# Altium footprint library Transformer_E.PcbLib: 16 footprints
Each footprint in its own frame and in the unit in brackets; x right, y up, seen from the top. Pads: shape width x height; smd on the part's side, far side on the other; paste and mask are expansions set on the pad; w line width, h text height; cw(c..) or ccw(c..) is an arc to the next point about the centre after c.
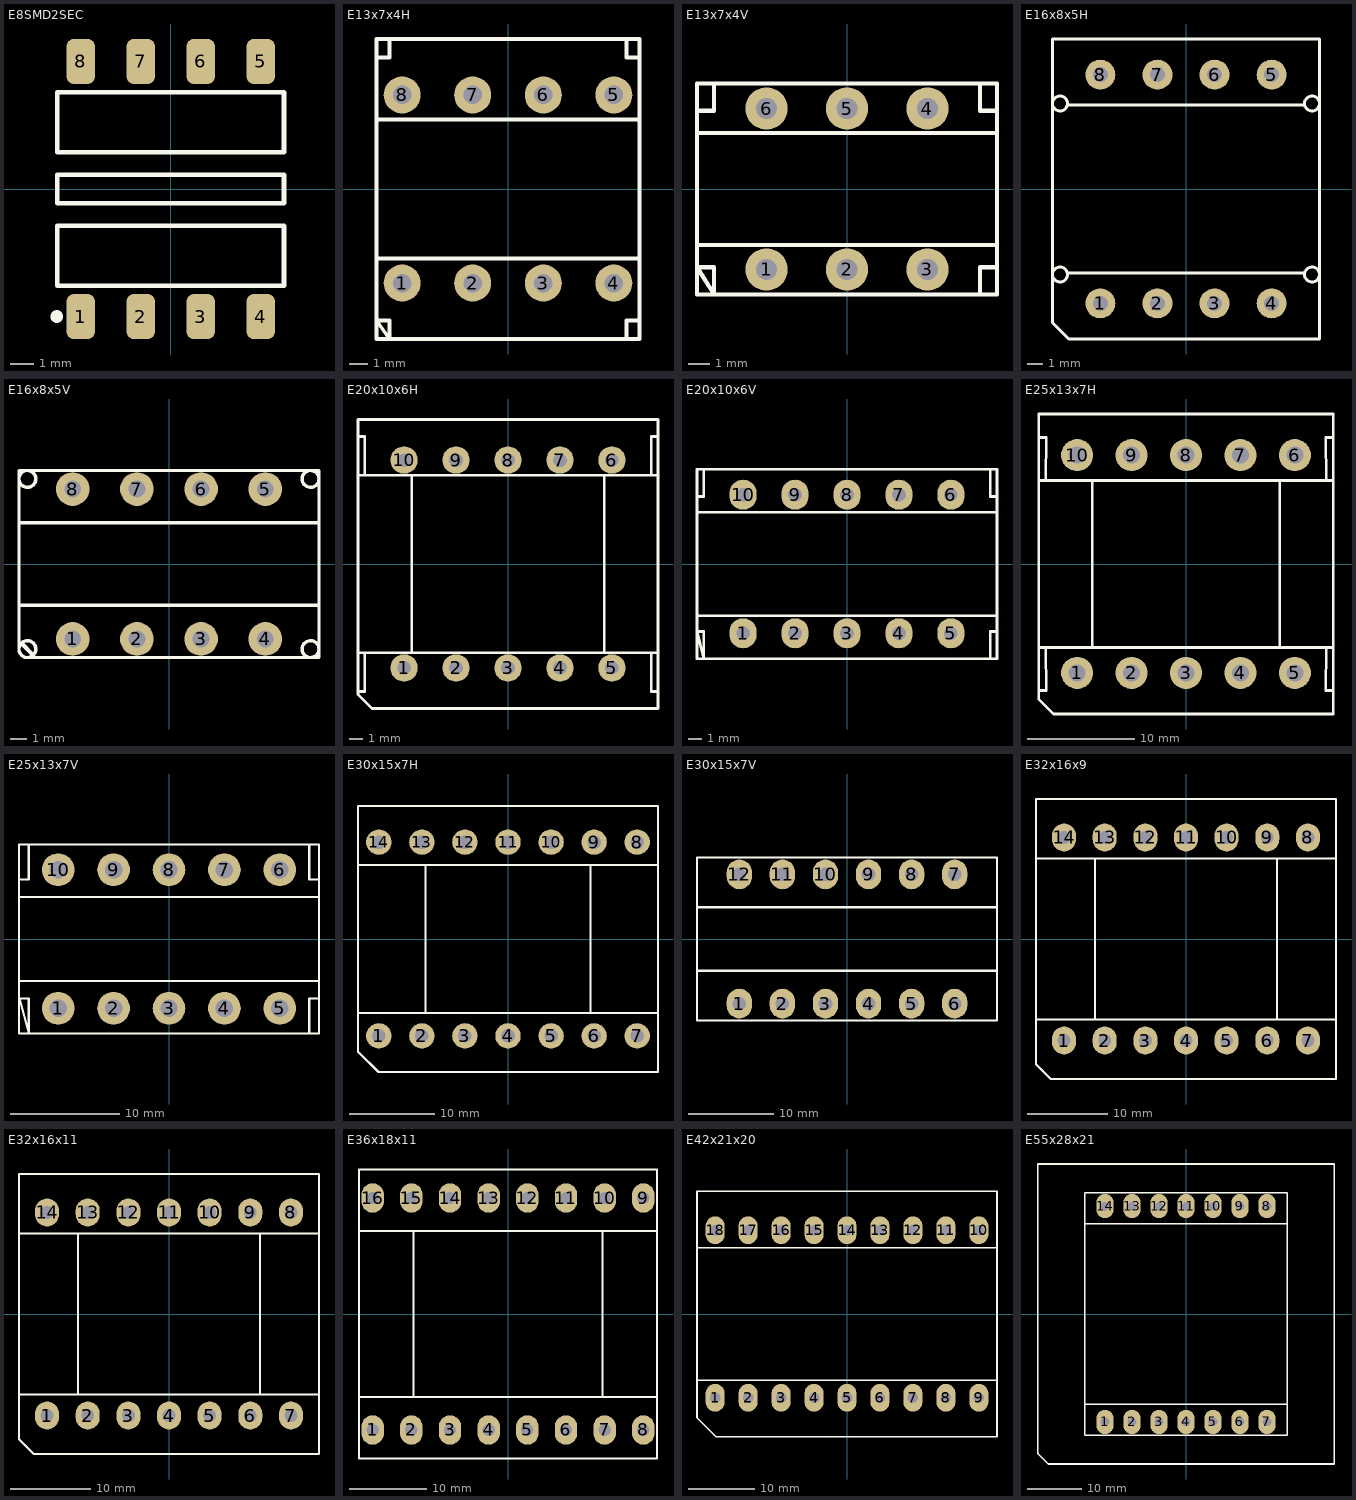
[diagram p0: the footprints below, top view; thin cyan lines are the x and y axes]

## E8SMD2SEC [mm]
pads (8):
  rrect50% 1.2x1.9 smd: 1(-3.81,-5.4) 2(-1.27,-5.4) 3(1.27,-5.4) 4(3.81,-5.4) 5(3.81,5.4) 6(1.27,5.4) 7(-1.27,5.4) 8(-3.81,5.4)
Top Overlay:
  circle w0.3: c-4.826,-5.4 r0.12
  lines w0.2: -4.8,-4.1 0,-4.1 4.8,-4.1 4.8,-1.55 0,-1.55 -4.8,-1.55 -4.8,-4.1 ; -4.8,-0.6 0,-0.6 4.8,-0.6 4.8,0 4.8,0.6 0,0.6 -4.8,0.6 -4.8,0 -4.8,-0.6 ; -4.8,1.55 -4.8,4.1 0,4.1 4.8,4.1 4.8,1.55 0,1.55 -4.8,1.55
3D body "E8SMD2SECTransformer.STEP": height 5.11, standoff -0.04, extent -4.8,-6.126 4.8,6.126

## E13x7x4H [mm]
pads (8):
  round 2 hole 1: 1(-5.715,-5.08) 2(-1.905,-5.08) 3(1.905,-5.08) 4(5.715,-5.08) 5(5.715,5.08) 6(1.905,5.08) 7(-1.905,5.08) 8(-5.715,5.08)
Top Overlay:
  lines w0.2: -7.1,-3.75 0,-3.75 7.1,-3.75 ; -7.1,3.75 0,3.75 7.1,3.75 ; -7.1,7.1 -6.4,7.1 ; -6.4,-7.112 -6.4,-8.1 -7.1,-7.1 -6.4,-7.1 ; -6.4,7.112 -6.4,8.1 ; 6.4,-8.1 6.4,-7.112 ; 6.4,-7.1 7.1,-7.1 ; 6.4,7.1 7.1,7.1 ; 6.4,7.112 6.4,8.1 ; -7.1,-8.1 -7.1,0 -7.1,8.1 0,8.1 7.1,8.1 7.1,0 7.1,-8.1 0,-8.1 -7.1,-8.1
3D body "E13x7x4HTransformer.STEP": height 11.9, standoff -3.5, extent -7.1,-8.1 7.1,8.1

## E13x7x4V [mm]
pads (6):
  round 2 hole 1: 1(-3.81,-3.81) 2(0,-3.81) 3(3.81,-3.81) 4(3.81,3.81) 5(0,3.81) 6(-3.81,3.81)
Top Overlay:
  lines w0.2: -7.1,-2.65 0,-2.65 7.1,-2.65 ; -7.1,2.65 0,2.65 7.1,2.65 ; -7.1,3.7 -6.35,3.7 ; -6.35,-3.7 -7.1,-3.7 -6.3,-4.953 -6.3,-3.7 ; -6.3,3.7 -6.3,4.953 ; 6.3,-4.953 6.3,-3.7 ; 6.3,3.7 6.3,4.953 ; 6.35,-3.7 7.1,-3.7 ; 6.35,3.7 7.1,3.7 ; -7.1,-5 0,-5 7.1,-5 7.1,0 7.1,5 0,5 -7.1,5 -7.1,0 -7.1,-5
3D body "E13x7x4VTransformer.STEP": height 15.93, standoff -3.5, extent -7.1,-5 7.1,5

## E16x8x5H [mm]
pads (8):
  round 2 hole 1: 1(-5.715,-7.62) 2(-1.905,-7.62) 3(1.905,-7.62) 4(5.715,-7.62) 5(5.715,7.62) 6(1.905,7.62) 7(-1.905,7.62) 8(-5.715,7.62)
Top Overlay:
  circle w0.2: c8.4,5.7 r0.5
  circle w0.2: c-8.4,5.7 r0.5
  circle w0.2: c8.4,-5.7 r0.5
  circle w0.2: c-8.4,-5.7 r0.5
  lines w0.2: -7.9,-5.6 0,-5.6 7.9,-5.6 ; -7.9,5.6 0,5.6 7.9,5.6 ; -8.9,-8.912 -8.9,0 -8.9,10 0,10 8.9,10 8.9,0 8.9,-10 0,-10 -7.812,-10 -8.9,-8.912
3D body "E16x8x5HTransformer.STEP": height 13.6, standoff -3.5, extent -8.9,-10 8.9,10

## E16x8x5V [mm]
pads (8):
  round 2 hole 1: 1(-5.715,-4.445) 2(-1.905,-4.445) 3(1.905,-4.445) 4(5.715,-4.445) 5(5.715,4.445) 6(1.905,4.445) 7(-1.905,4.445) 8(-5.715,4.445)
Top Overlay:
  circle w0.2: c-8.4,5.05 r0.5
  circle w0.2: c8.4,-5.05 r0.5
  circle w0.2: c-8.4,-5.05 r0.5
  circle w0.2: c8.4,5.05 r0.5
  lines w0.2: -8.9,-4.953 -8.9,0 -8.9,5.55 0,5.55 8.9,5.55 8.9,0 8.9,-5.55 0,-5.55 -8.3,-5.55 ; -8.9,-2.45 0,-2.45 8.9,-2.45 ; -8.9,2.45 0,2.45 8.9,2.45
  lines w0.254: -8.74,-4.726 -8.105,-5.361
3D body "E16x8x5VTransformer.STEP": height 18.78, standoff -3.5, extent -8.9,-5.55 8.9,5.55

## E20x10x6H [mm]
pads (10):
  round 2 hole 1: 1(-7.62,-7.62) 2(-3.81,-7.62) 3(0,-7.62) 4(3.81,-7.62) 5(7.62,-7.62) 6(7.62,7.62) 7(3.81,7.62) 8(0,7.62) 9(-3.81,7.62) 10(-7.62,7.62)
Top Overlay:
  lines w0.2: -11,-9.35 -10.5,-9.35 -10.5,-6.5 ; -11,-6.5 0,-6.5 11,-6.5 ; -11,6.5 0,6.5 11,6.5 ; -11,9.35 -10.5,9.35 -10.5,6.5 ; -7.05,-6.5 -7.05,0 -7.05,6.5 ; 7.05,-6.5 7.05,0 7.05,6.5 ; 10.5,-6.5 10.5,-9.35 11,-9.35 ; 10.5,6.5 10.5,9.35 11,9.35 ; -11,-9.574 -11,0 -11,10.6 0,10.6 11,10.6 11,0 11,-10.6 0,-10.6 -9.974,-10.6 -11,-9.574
3D body "E20x10x6HTransformer.STEP": height 16.6, standoff -3.5, extent -11,-10.6 11,10.6

## E20x10x6V [mm]
pads (10):
  oval 2x2.2 hole 1: 1(-7.62,-5.08) 2(-3.81,-5.08) 3(0,-5.08) 4(3.81,-5.08) 5(7.62,-5.08) 6(7.62,5.08) 7(3.81,5.08) 8(0,5.08) 9(-3.81,5.08) 10(-7.62,5.08)
Top Overlay:
  lines w0.2: -11,-3.8 0,-3.8 11,-3.8 ; -11,3.8 0,3.8 11,3.8 ; -11,4.95 -10.5,4.95 -10.5,6.931 ; 10.5,-6.931 10.5,-4.95 11,-4.95 ; 10.5,6.931 10.5,4.95 11,4.95 ; -11,-6.95 -11,0 -11,6.95 0,6.95 11,6.95 11,0 11,-6.95 0,-6.95 -11,-6.95 ; -11,-4.95 -10.5,-4.95 -10.5,-6.931 -11,-4.95
3D body "E20x10x6VTransformer.STEP": height 23.03, standoff -3.5, extent -11,-6.95 11,6.95

## E25x13x7H [mm]
pads (10):
  round 3 hole 1.6: 1(-10.16,-10.16) 2(-5.08,-10.16) 3(0,-10.16) 4(5.08,-10.16) 5(10.16,-10.16) 6(10.16,10.16) 7(5.08,10.16) 8(0,10.16) 9(-5.08,10.16) 10(-10.16,10.16)
Top Overlay:
  lines w0.254: -13.75,-11.8 -13.05,-11.8 -13.081,-7.874 ; -13.75,-7.8 0,-7.8 13.75,-7.8 ; -13.75,7.8 0,7.8 13.75,7.8 ; -13.75,11.8 -13.05,11.8 -13.081,7.874 ; -8.75,-7.7 -8.75,0 -8.75,7.7 ; 8.75,-7.7 8.75,0 8.75,7.7 ; 13.081,-7.874 13.05,-11.8 13.75,-11.8 ; 13.081,7.874 13.05,11.8 13.75,11.8 ; -13.75,-12.616 -13.75,0 -13.75,14 0,14 13.75,14 13.75,0 13.75,-14 0,-14 -12.366,-14 -13.75,-12.616
3D body "E25x13x7HTransformer.STEP": height 20, standoff -3.5, extent -13.75,-14 13.75,14

## E25x13x7V [mm]
pads (10):
  round 3 hole 1.6: 1(-10.16,-6.35) 2(-5.08,-6.35) 3(0,-6.35) 4(5.08,-6.35) 5(10.16,-6.35) 6(10.16,6.35) 7(5.08,6.35) 8(0,6.35) 9(-5.08,6.35) 10(-10.16,6.35)
Top Overlay:
  lines w0.2: -13.75,-3.85 0,-3.85 13.75,-3.85 ; -13.75,3.85 0,3.85 13.75,3.85 ; -13.716,5.45 -12.85,5.45 -12.85,8.65 ; 12.85,-8.65 12.85,-5.45 13.716,-5.45 ; 12.85,8.65 12.85,5.45 13.716,5.45 ; -13.75,-8.65 0,-8.65 13.75,-8.65 13.75,0 13.75,8.65 0,8.65 -13.75,8.65 -13.75,0 -13.75,-8.65 ; -13.716,-5.45 -12.85,-5.45 -12.85,-8.65 -13.716,-5.45
3D body "E25x13x7VTransformer.STEP": height 28.13, standoff -3.6, extent -13.75,-8.65 13.75,8.65

## E30x15x7H [mm]
pads (14):
  round 3 hole 1.6: 1(-15.24,-11.43) 2(-10.16,-11.43) 3(-5.08,-11.43) 4(0,-11.43) 5(5.08,-11.43) 6(10.16,-11.43) 7(15.24,-11.43) 8(15.24,11.43) 9(10.16,11.43) 10(5.08,11.43) 11(0,11.43) 12(-5.08,11.43) 13(-10.16,11.43) 14(-15.24,11.43)
Top Overlay:
  lines w0.254: -17.7,-8.75 0,-8.75 17.7,-8.75 ; -17.7,8.75 0,8.75 17.7,8.75 ; -9.75,-8.75 -9.75,0 -9.75,8.75 ; 9.75,-8.75 9.75,0 9.75,8.75 ; -17.7,-13.288 -15.288,-15.7 0,-15.7 17.7,-15.7 17.7,0 17.7,15.7 0,15.7 -17.7,15.7 -17.7,0 -17.7,-13.288
3D body "E30x15x7HTransformer.STEP": height 22.45, standoff -3.3, extent -17.7,-16.2 17.7,16.2

## E30x15x7V [mm]
pads (12):
  oval 3x3.5 hole 1.6: 1(-12.7,-7.62) 2(-7.62,-7.62) 3(-2.54,-7.62) 4(2.54,-7.62) 5(7.62,-7.62) 6(12.7,-7.62) 7(12.7,7.62) 8(7.62,7.62) 9(2.54,7.62) 10(-2.54,7.62) 11(-7.62,7.62) 12(-12.7,7.62)
Top Overlay:
  lines w0.254: -17.7,-3.75 0,-3.75 17.7,-3.75 ; -17.7,3.75 0,3.75 17.7,3.75 ; -17.7,-9.6 -17.7,0 -17.7,9.6 0,9.6 17.7,9.6 17.7,0 17.7,-9.6 0,-9.6 -17.7,-9.6
3D body "E30x15x7VTransformer.STEP": height 35.35, standoff -3.5, extent -17.7,-9.6 17.7,9.6

## E32x16x9 [mm]
pads (14):
  oval 3x3.5 hole 1.6: 1(-15.24,-12.7) 2(-10.16,-12.7) 3(-5.08,-12.7) 4(0,-12.7) 5(5.08,-12.7) 6(10.16,-12.7) 7(15.24,-12.7) 8(15.24,12.7) 9(10.16,12.7) 10(5.08,12.7) 11(0,12.7) 12(-5.08,12.7) 13(-10.16,12.7) 14(-15.24,12.7)
Top Overlay:
  lines w0.254: -18.75,-10.05 0,-10.05 18.75,-10.05 ; -18.75,10.05 0,10.05 18.75,10.05 ; -11.35,-10.05 -11.35,0 -11.35,10.05 ; 11.35,-10.05 11.35,0 11.35,10.05 ; -18.75,-15.667 -16.917,-17.5 0,-17.5 18.75,-17.5 18.75,0 18.75,17.5 0,17.5 -18.75,17.5 -18.75,0 -18.75,-15.667
3D body "E32x16x9HTransformer.STEP": height 25.9, standoff -3.5, extent -18.75,-17.546 18.75,17.546

## E32x16x11 [mm]
pads (14):
  oval 3x3.5 hole 1.6: 1(-15.24,-12.7) 2(-10.16,-12.7) 3(-5.08,-12.7) 4(0,-12.7) 5(5.08,-12.7) 6(10.16,-12.7) 7(15.24,-12.7) 8(15.24,12.7) 9(10.16,12.7) 10(5.08,12.7) 11(0,12.7) 12(-5.08,12.7) 13(-10.16,12.7) 14(-15.24,12.7)
Top Overlay:
  lines w0.254: -18.75,-10.05 0,-10.05 18.75,-10.05 ; -18.75,10.05 0,10.05 18.75,10.05 ; -11.35,-10.05 -11.35,0 -11.35,10.05 ; 11.35,-10.05 11.35,0 11.35,10.05 ; -18.75,-15.667 -18.75,0 -18.75,17.5 0,17.5 18.75,17.5 18.75,0 18.75,-17.5 0,-17.5 -16.917,-17.5 -18.75,-15.667
3D body "E32x16x11HTransformer.STEP": height 27.4, standoff -3.5, extent -18.75,-17.546 18.75,17.546

## E36x18x11 [mm]
pads (16):
  oval 2.9x3.8 hole 1.6: 1(-17.5,-15) 2(-12.5,-15) 3(-7.5,-15) 4(-2.5,-15) 5(2.5,-15) 6(7.5,-15) 7(12.5,-15) 8(17.5,-15) 9(17.5,15) 10(12.5,15) 11(7.5,15) 12(2.5,15) 13(-2.5,15) 14(-7.5,15) 15(-12.5,15) 16(-17.5,15)
Top Overlay:
  lines w0.254: -19.25,-10.75 0,-10.75 19.25,-10.75 ; -19.25,10.75 0,10.75 19.25,10.75 ; -12.25,-10.75 -12.25,0 -12.25,10.75 ; 12.25,-10.75 12.25,0 12.25,10.75 ; -19.25,-18.7 -19.25,0 -19.25,18.7 0,18.7 19.25,18.7 19.25,0 19.25,-18.7 0,-18.7 -19.25,-18.7
3D body "E36x18x11HTransformer.STEP": height 30.45, standoff -3.5, extent -19.25,-18.6 19.25,18.6

## E42x21x20 [mm]
pads (18):
  oval 2.9x4.2 hole 1.6: 1(-20,-12.7) 2(-15,-12.7) 3(-10,-12.7) 4(-5,-12.7) 5(0,-12.7) 6(5,-12.7) 7(10,-12.7) 8(15,-12.7) 9(20,-12.7) 10(20,12.7) 11(15,12.7) 12(10,12.7) 13(5,12.7) 14(0,12.7) 15(-5,12.7) 16(-10,12.7) 17(-15,12.7) 18(-20,12.7)
Top Overlay:
  lines w0.254: -22.75,-10.05 0,-10.05 22.75,-10.05 ; -22.75,10.05 0,10.05 22.75,10.05 ; -22.75,-15.731 -19.881,-18.6 0,-18.6 22.75,-18.6 22.75,0 22.75,18.6 0,18.6 -22.75,18.6 -22.75,0 -22.75,-15.731
3D body "E42x21x20V18PTransformer.STEP": height 51.3, standoff -6.1, extent -22.75,-18.575 22.75,18.575

## E55x28x21 [mm]
pads (14):
  oval 3.2x4.5 hole 1.6: 1(-15,-20) 2(-10,-20) 3(-5,-20) 4(0,-20) 5(5,-20) 6(10,-20) 7(15,-20) 8(15,20) 9(10,20) 10(5,20) 11(0,20) 12(-5,20) 13(-10,20) 14(-15,20)
Top Overlay:
  lines w0.3: -18.75,-16.764 -18.75,0 -18.75,16.764 ; 18.75,-16.764 18.75,0 18.75,16.764 ; -27.5,-25.84 -25.54,-27.8 0,-27.8 27.5,-27.8 27.5,0 27.5,27.8 0,27.8 -27.5,27.8 -27.5,0 -27.5,-25.84 ; -18.75,-22.5 0,-22.5 18.75,-22.5 18.75,-16.7 0,-16.7 -18.75,-16.7 -18.75,-22.5 ; -18.75,16.7 0,16.7 18.75,16.7 18.75,22.5 0,22.5 -18.75,22.5 -18.75,16.7
3D body "E55x28x21HTransformer.STEP": height 44, standoff -6, extent -27.58,-27.885 27.58,27.88